# Altium schematic symbol library jlcpcb_2025_04_capacitors_extended_0402.schlib: 3594 symbols (part 2 of 20) (continued)
## 0402CG470J250NT
designator C?  Capacitance: 47pF  (hidden comment: *)
Capacitor, Ceramic (MLCC), 47pF, ±5%, 25V, C0G, ±5%, SMD 0402; Manufacturer: FH (Guangdong Fenghua Advanced Tech); Manufacturer Part Number: 0402CG470J250NT; Package Size: 0402; JLCPCB Basic Part: No; JLCPCB Part Number: C2991692; Supplier 1: LCSC; Category: Capacitors - MLCC; Supplier Part Number 1: C2991692; Tolerance: ±5%; Voltage Rating: 25V; Temperature Coefficient: C0G; RoHS: Yes; ComponentLink1Description: Datasheet; ComponentLink1URL: https://wmsc.lcsc.com/wmsc/upload/file/pdf/v2/lcsc/2204111630_FH--Guangdong-Fenghua-Advanced-Tech-0402CG470J250NT_C2991692.pdf; ComponentLink2Description: JLCPCB Part URL; ComponentLink2URL: https://jlcpcb.com/partdetail/C2991692; ComponentLink3Description: LCSC Part URL; ComponentLink3URL: https://lcsc.com/product-detail/Multilayer-Ceramic-Capacitors-MLCC---SMD-SMT_FH-Guangdong-Fenghua-Advanced-Tech-FH-Guangdong-Fenghua-Advanced-Tech-0402CG470J250NT_C2991692.html
footprint CAP-0402 (0402 (1005M) Capacitor)
pins: 1, 2

## 0402CG471J500NT
designator C?  Capacitance: 470pF  (hidden comment: *)
Capacitor, Ceramic (MLCC), 470pF, ±5%, 50V, C0G, ±5%, SMD 0402; Manufacturer: FH(Guangdong Fenghua Advanced Tech); Manufacturer Part Number: 0402CG471J500NT; Package Size: 0402; JLCPCB Basic Part: No; JLCPCB Part Number: C75274; Supplier 1: LCSC; Category: Capacitors - MLCC; Supplier Part Number 1: C75274; Tolerance: ±5%; Voltage Rating: 50V; Temperature Coefficient: C0G; RoHS: Yes; ComponentLink1Description: Datasheet; ComponentLink1URL: https://wmsc.lcsc.com/wmsc/upload/file/pdf/v2/lcsc/2304140030_FH--Guangdong-Fenghua-Advanced-Tech-0402CG471J500NT_C75274.pdf; ComponentLink2Description: JLCPCB Part URL; ComponentLink2URL: https://jlcpcb.com/partdetail/C75274; ComponentLink3Description: LCSC Part URL; ComponentLink3URL: https://lcsc.com/product-detail/Multilayer-Ceramic-Capacitors-MLCC---SMD-SMT_FH-Guangdong-Fenghua-Advanced-Tech-FH-Guangdong-Fenghua-Advanced-Tech-0402CG471J500NT_C75274.html
footprint CAP-0402 (0402 (1005M) Capacitor)
pins: 1, 2

## 0402CG500J500NT
designator C?  Capacitance: 50pF  (hidden comment: *)
Capacitor, Ceramic (MLCC), 50pF, ±5%, 50V, C0G, ±5%, SMD 0402; Manufacturer: FH(Guangdong Fenghua Advanced Tech); Manufacturer Part Number: 0402CG500J500NT; Package Size: 0402; JLCPCB Basic Part: No; JLCPCB Part Number: C501830; Supplier 1: LCSC; Category: Capacitors - MLCC; Supplier Part Number 1: C501830; Tolerance: ±5%; Voltage Rating: 50V; Temperature Coefficient: C0G; RoHS: Yes; ComponentLink1Description: Datasheet; ComponentLink1URL: https://wmsc.lcsc.com/wmsc/upload/file/pdf/v2/lcsc/2304140030_FH--Guangdong-Fenghua-Advanced-Tech-0402CG500J500NT_C501830.pdf; ComponentLink2Description: JLCPCB Part URL; ComponentLink2URL: https://jlcpcb.com/partdetail/C501830; ComponentLink3Description: LCSC Part URL; ComponentLink3URL: https://lcsc.com/product-detail/Multilayer-Ceramic-Capacitors-MLCC---SMD-SMT_FH-Guangdong-Fenghua-Advanced-Tech-FH-Guangdong-Fenghua-Advanced-Tech-0402CG500J500NT_C501830.html
footprint CAP-0402 (0402 (1005M) Capacitor)
pins: 1, 2

## 0402CG510J500NT
designator C?  Capacitance: 51pF  (hidden comment: *)
Capacitor, Ceramic (MLCC), 51pF, ±5%, 50V, C0G, ±5%, SMD 0402; Manufacturer: FH(Guangdong Fenghua Advanced Tech); Manufacturer Part Number: 0402CG510J500NT; Package Size: 0402; JLCPCB Basic Part: No; JLCPCB Part Number: C1571; Supplier 1: LCSC; Category: Capacitors - MLCC; Supplier Part Number 1: C1571; Tolerance: ±5%; Voltage Rating: 50V; Temperature Coefficient: C0G; RoHS: Yes; ComponentLink1Description: Datasheet; ComponentLink1URL: https://wmsc.lcsc.com/wmsc/upload/file/pdf/v2/lcsc/2304140030_FH--Guangdong-Fenghua-Advanced-Tech-0402CG510J500NT_C1571.pdf; ComponentLink2Description: JLCPCB Part URL; ComponentLink2URL: https://jlcpcb.com/partdetail/C1571; ComponentLink3Description: LCSC Part URL; ComponentLink3URL: https://lcsc.com/product-detail/Multilayer-Ceramic-Capacitors-MLCC---SMD-SMT_FH-Guangdong-Fenghua-Advanced-Tech-FH-Guangdong-Fenghua-Advanced-Tech-0402CG510J500NT_C1571.html
footprint CAP-0402 (0402 (1005M) Capacitor)
pins: 1, 2

## 0402CG560J500NT
designator C?  Capacitance: 56pF  (hidden comment: *)
Capacitor, Ceramic (MLCC), 56pF, ±5%, 50V, C0G, ±5%, SMD 0402; Manufacturer: FH(Guangdong Fenghua Advanced Tech); Manufacturer Part Number: 0402CG560J500NT; Package Size: 0402; JLCPCB Basic Part: No; JLCPCB Part Number: C1572; Supplier 1: LCSC; Category: Capacitors - MLCC; Supplier Part Number 1: C1572; Tolerance: ±5%; Voltage Rating: 50V; Temperature Coefficient: C0G; RoHS: Yes; ComponentLink1Description: Datasheet; ComponentLink1URL: https://wmsc.lcsc.com/wmsc/upload/file/pdf/v2/lcsc/2304140030_FH--Guangdong-Fenghua-Advanced-Tech-0402CG560J500NT_C1572.pdf; ComponentLink2Description: JLCPCB Part URL; ComponentLink2URL: https://jlcpcb.com/partdetail/C1572; ComponentLink3Description: LCSC Part URL; ComponentLink3URL: https://lcsc.com/product-detail/Multilayer-Ceramic-Capacitors-MLCC---SMD-SMT_FH-Guangdong-Fenghua-Advanced-Tech-FH-Guangdong-Fenghua-Advanced-Tech-0402CG560J500NT_C1572.html
footprint CAP-0402 (0402 (1005M) Capacitor)
pins: 1, 2

## 0402CG561J500NT
designator C?  Capacitance: 560pF  (hidden comment: *)
Capacitor, Ceramic (MLCC), 560pF, ±5%, 50V, C0G, ±5%, SMD 0402; Manufacturer: FH (Guangdong Fenghua Advanced Tech); Manufacturer Part Number: 0402CG561J500NT; Package Size: 0402; JLCPCB Basic Part: No; JLCPCB Part Number: C967570; Supplier 1: LCSC; Category: Capacitors - MLCC; Supplier Part Number 1: C967570; Tolerance: ±5%; Voltage Rating: 50V; Temperature Coefficient: C0G; RoHS: Yes; ComponentLink1Description: Datasheet; ComponentLink1URL: https://wmsc.lcsc.com/wmsc/upload/file/pdf/v2/lcsc/2304140030_FH--Guangdong-Fenghua-Advanced-Tech-0402CG561J500NT_C967570.pdf; ComponentLink2Description: JLCPCB Part URL; ComponentLink2URL: https://jlcpcb.com/partdetail/C967570; ComponentLink3Description: LCSC Part URL; ComponentLink3URL: https://lcsc.com/product-detail/Multilayer-Ceramic-Capacitors-MLCC---SMD-SMT_FH-Guangdong-Fenghua-Advanced-Tech-FH-Guangdong-Fenghua-Advanced-Tech-0402CG561J500NT_C967570.html
footprint CAP-0402 (0402 (1005M) Capacitor)
pins: 1, 2

## 0402CG620J500NT
designator C?  Capacitance: 62pF  (hidden comment: *)
Capacitor, Ceramic (MLCC), 62pF, ±5%, 50V, C0G, ±5%, SMD 0402; Manufacturer: FH(Guangdong Fenghua Advanced Tech); Manufacturer Part Number: 0402CG620J500NT; Package Size: 0402; JLCPCB Basic Part: No; JLCPCB Part Number: C33953; Supplier 1: LCSC; Category: Capacitors - MLCC; Supplier Part Number 1: C33953; Tolerance: ±5%; Voltage Rating: 50V; Temperature Coefficient: C0G; RoHS: Yes; ComponentLink1Description: Datasheet; ComponentLink1URL: https://wmsc.lcsc.com/wmsc/upload/file/pdf/v2/lcsc/2304140030_FH--Guangdong-Fenghua-Advanced-Tech-0402CG620J500NT_C33953.pdf; ComponentLink2Description: JLCPCB Part URL; ComponentLink2URL: https://jlcpcb.com/partdetail/C33953; ComponentLink3Description: LCSC Part URL; ComponentLink3URL: https://lcsc.com/product-detail/Multilayer-Ceramic-Capacitors-MLCC---SMD-SMT_FH-Guangdong-Fenghua-Advanced-Tech-FH-Guangdong-Fenghua-Advanced-Tech-0402CG620J500NT_C33953.html
footprint CAP-0402 (0402 (1005M) Capacitor)
pins: 1, 2

## 0402CG680J500NT
designator C?  Capacitance: 68pF  (hidden comment: *)
Capacitor, Ceramic (MLCC), 68pF, ±5%, 50V, C0G, ±5%, SMD 0402; Manufacturer: FH(Guangdong Fenghua Advanced Tech); Manufacturer Part Number: 0402CG680J500NT; Package Size: 0402; JLCPCB Basic Part: No; JLCPCB Part Number: C190580; Supplier 1: LCSC; Category: Capacitors - MLCC; Supplier Part Number 1: C190580; Tolerance: ±5%; Voltage Rating: 50V; Temperature Coefficient: C0G; RoHS: Yes; ComponentLink1Description: Datasheet; ComponentLink1URL: https://wmsc.lcsc.com/wmsc/upload/file/pdf/v2/lcsc/2304140030_FH--Guangdong-Fenghua-Advanced-Tech-0402CG680J500NT_C190580.pdf; ComponentLink2Description: JLCPCB Part URL; ComponentLink2URL: https://jlcpcb.com/partdetail/C190580; ComponentLink3Description: LCSC Part URL; ComponentLink3URL: https://lcsc.com/product-detail/Multilayer-Ceramic-Capacitors-MLCC---SMD-SMT_FH-Guangdong-Fenghua-Advanced-Tech-FH-Guangdong-Fenghua-Advanced-Tech-0402CG680J500NT_C190580.html
footprint CAP-0402 (0402 (1005M) Capacitor)
pins: 1, 2

## 0402CG681J500NT
designator C?  Capacitance: 680pF  (hidden comment: *)
Capacitor, Ceramic (MLCC), 680pF, ±5%, 50V, C0G, ±5%, SMD 0402; Manufacturer: FH (Guangdong Fenghua Advanced Tech); Manufacturer Part Number: 0402CG681J500NT; Package Size: 0402; JLCPCB Basic Part: No; JLCPCB Part Number: C301953; Supplier 1: LCSC; Category: Capacitors - MLCC; Supplier Part Number 1: C301953; Tolerance: ±5%; Voltage Rating: 50V; Temperature Coefficient: C0G; RoHS: Yes; ComponentLink1Description: Datasheet; ComponentLink1URL: https://wmsc.lcsc.com/wmsc/upload/file/pdf/v2/lcsc/2304140030_FH--Guangdong-Fenghua-Advanced-Tech-0402CG681J500NT_C301953.pdf; ComponentLink2Description: JLCPCB Part URL; ComponentLink2URL: https://jlcpcb.com/partdetail/C301953; ComponentLink3Description: LCSC Part URL; ComponentLink3URL: https://lcsc.com/product-detail/Multilayer-Ceramic-Capacitors-MLCC---SMD-SMT_FH-Guangdong-Fenghua-Advanced-Tech-FH-Guangdong-Fenghua-Advanced-Tech-0402CG681J500NT_C301953.html
footprint CAP-0402 (0402 (1005M) Capacitor)
pins: 1, 2

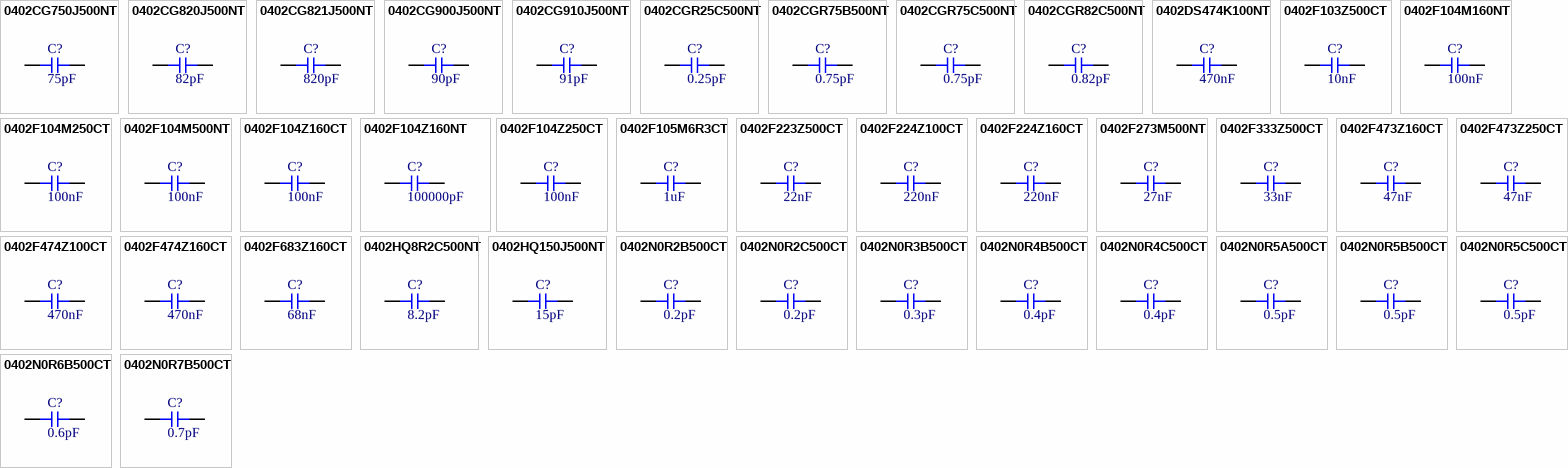
[diagram p8: symbols 0402CG750J500NT to 0402N0R7B500CT]

## 0402CG750J500NT
designator C?  Capacitance: 75pF  (hidden comment: *)
Capacitor, Ceramic (MLCC), 75pF, ±5%, 50V, C0G, ±5%, SMD 0402; Manufacturer: FH(Guangdong Fenghua Advanced Tech); Manufacturer Part Number: 0402CG750J500NT; Package Size: 0402; JLCPCB Basic Part: No; JLCPCB Part Number: C37809; Supplier 1: LCSC; Category: Capacitors - MLCC; Supplier Part Number 1: C37809; Tolerance: ±5%; Voltage Rating: 50V; Temperature Coefficient: C0G; RoHS: Yes; ComponentLink1Description: Datasheet; ComponentLink1URL: https://wmsc.lcsc.com/wmsc/upload/file/pdf/v2/lcsc/2304140030_FH--Guangdong-Fenghua-Advanced-Tech-0402CG750J500NT_C37809.pdf; ComponentLink2Description: JLCPCB Part URL; ComponentLink2URL: https://jlcpcb.com/partdetail/C37809; ComponentLink3Description: LCSC Part URL; ComponentLink3URL: https://lcsc.com/product-detail/Multilayer-Ceramic-Capacitors-MLCC---SMD-SMT_FH-Guangdong-Fenghua-Advanced-Tech-FH-Guangdong-Fenghua-Advanced-Tech-0402CG750J500NT_C37809.html
footprint CAP-0402 (0402 (1005M) Capacitor)
pins: 1, 2

## 0402CG820J500NT
designator C?  Capacitance: 82pF  (hidden comment: *)
Capacitor, Ceramic (MLCC), 82pF, ±5%, 50V, C0G, ±5%, SMD 0402; Manufacturer: FH(Guangdong Fenghua Advanced Tech); Manufacturer Part Number: 0402CG820J500NT; Package Size: 0402; JLCPCB Basic Part: No; JLCPCB Part Number: C45501; Supplier 1: LCSC; Category: Capacitors - MLCC; Supplier Part Number 1: C45501; Tolerance: ±5%; Voltage Rating: 50V; Temperature Coefficient: C0G; RoHS: Yes; ComponentLink1Description: Datasheet; ComponentLink1URL: https://wmsc.lcsc.com/wmsc/upload/file/pdf/v2/lcsc/2304140030_FH--Guangdong-Fenghua-Advanced-Tech-0402CG820J500NT_C45501.pdf; ComponentLink2Description: JLCPCB Part URL; ComponentLink2URL: https://jlcpcb.com/partdetail/C45501; ComponentLink3Description: LCSC Part URL; ComponentLink3URL: https://lcsc.com/product-detail/Multilayer-Ceramic-Capacitors-MLCC---SMD-SMT_FH-Guangdong-Fenghua-Advanced-Tech-FH-Guangdong-Fenghua-Advanced-Tech-0402CG820J500NT_C45501.html
footprint CAP-0402 (0402 (1005M) Capacitor)
pins: 1, 2

## 0402CG821J500NT
designator C?  Capacitance: 820pF  (hidden comment: *)
Capacitor, Ceramic (MLCC), 820pF, ±5%, 50V, C0G, ±5%, SMD 0402; Manufacturer: FH (Guangdong Fenghua Advanced Tech); Manufacturer Part Number: 0402CG821J500NT; Package Size: 0402; JLCPCB Basic Part: No; JLCPCB Part Number: C913875; Supplier 1: LCSC; Category: Capacitors - MLCC; Supplier Part Number 1: C913875; Tolerance: ±5%; Voltage Rating: 50V; Temperature Coefficient: C0G; RoHS: Yes; ComponentLink1Description: Datasheet; ComponentLink1URL: https://wmsc.lcsc.com/wmsc/upload/file/pdf/v2/lcsc/2304140030_FH--Guangdong-Fenghua-Advanced-Tech-0402CG821J500NT_C913875.pdf; ComponentLink2Description: JLCPCB Part URL; ComponentLink2URL: https://jlcpcb.com/partdetail/C913875; ComponentLink3Description: LCSC Part URL; ComponentLink3URL: https://lcsc.com/product-detail/Multilayer-Ceramic-Capacitors-MLCC---SMD-SMT_FH-Guangdong-Fenghua-Advanced-Tech-FH-Guangdong-Fenghua-Advanced-Tech-0402CG821J500NT_C913875.html
footprint CAP-0402 (0402 (1005M) Capacitor)
pins: 1, 2

## 0402CG900J500NT
designator C?  Capacitance: 90pF  (hidden comment: *)
Capacitor, Ceramic (MLCC), 90pF, ±5%, 50V, C0G, ±5%, SMD 0402; Manufacturer: FH(Guangdong Fenghua Advanced Tech); Manufacturer Part Number: 0402CG900J500NT; Package Size: 0402; JLCPCB Basic Part: No; JLCPCB Part Number: C501832; Supplier 1: LCSC; Category: Capacitors - MLCC; Supplier Part Number 1: C501832; Tolerance: ±5%; Voltage Rating: 50V; Temperature Coefficient: C0G; RoHS: Yes; ComponentLink1Description: Datasheet; ComponentLink1URL: https://wmsc.lcsc.com/wmsc/upload/file/pdf/v2/lcsc/2304140030_FH--Guangdong-Fenghua-Advanced-Tech-0402CG900J500NT_C501832.pdf; ComponentLink2Description: JLCPCB Part URL; ComponentLink2URL: https://jlcpcb.com/partdetail/C501832; ComponentLink3Description: LCSC Part URL; ComponentLink3URL: https://lcsc.com/product-detail/Multilayer-Ceramic-Capacitors-MLCC---SMD-SMT_FH-Guangdong-Fenghua-Advanced-Tech-FH-Guangdong-Fenghua-Advanced-Tech-0402CG900J500NT_C501832.html
footprint CAP-0402 (0402 (1005M) Capacitor)
pins: 1, 2

## 0402CG910J500NT
designator C?  Capacitance: 91pF  (hidden comment: *)
Capacitor, Ceramic (MLCC), 91pF, ±5%, 50V, C0G, ±5%, SMD 0402; Manufacturer: FH(Guangdong Fenghua Advanced Tech); Manufacturer Part Number: 0402CG910J500NT; Package Size: 0402; JLCPCB Basic Part: No; JLCPCB Part Number: C44548; Supplier 1: LCSC; Category: Capacitors - MLCC; Supplier Part Number 1: C44548; Tolerance: ±5%; Voltage Rating: 50V; Temperature Coefficient: C0G; RoHS: Yes; ComponentLink1Description: Datasheet; ComponentLink1URL: https://wmsc.lcsc.com/wmsc/upload/file/pdf/v2/lcsc/2304140030_FH--Guangdong-Fenghua-Advanced-Tech-0402CG910J500NT_C44548.pdf; ComponentLink2Description: JLCPCB Part URL; ComponentLink2URL: https://jlcpcb.com/partdetail/C44548; ComponentLink3Description: LCSC Part URL; ComponentLink3URL: https://lcsc.com/product-detail/Multilayer-Ceramic-Capacitors-MLCC---SMD-SMT_FH-Guangdong-Fenghua-Advanced-Tech-FH-Guangdong-Fenghua-Advanced-Tech-0402CG910J500NT_C44548.html
footprint CAP-0402 (0402 (1005M) Capacitor)
pins: 1, 2

## 0402CGR25C500NT
designator C?  Capacitance: 0.25pF  (hidden comment: *)
Capacitor, Ceramic (MLCC), 0.25pF, 50V, C0G, SMD 0402; Manufacturer: FH(Guangdong Fenghua Advanced Tech); Manufacturer Part Number: 0402CGR25C500NT; Package Size: 0402; JLCPCB Basic Part: No; JLCPCB Part Number: C501833; Supplier 1: LCSC; Category: Capacitors - MLCC; Supplier Part Number 1: C501833; Voltage Rating: 50V; Temperature Coefficient: C0G; RoHS: Yes; ComponentLink1Description: Datasheet; ComponentLink1URL: https://wmsc.lcsc.com/wmsc/upload/file/pdf/v2/lcsc/2304140030_FH--Guangdong-Fenghua-Advanced-Tech-0402CGR25C500NT_C501833.pdf; ComponentLink2Description: JLCPCB Part URL; ComponentLink2URL: https://jlcpcb.com/partdetail/C501833; ComponentLink3Description: LCSC Part URL; ComponentLink3URL: https://lcsc.com/product-detail/Multilayer-Ceramic-Capacitors-MLCC---SMD-SMT_FH-Guangdong-Fenghua-Advanced-Tech-FH-Guangdong-Fenghua-Advanced-Tech-0402CGR25C500NT_C501833.html
footprint CAP-0402 (0402 (1005M) Capacitor)
pins: 1, 2

## 0402CGR75B500NT
designator C?  Capacitance: 0.75pF  (hidden comment: *)
Capacitor, Ceramic (MLCC), 0.75pF, 50V, C0G, SMD 0402; Manufacturer: FH(Guangdong Fenghua Advanced Tech); Manufacturer Part Number: 0402CGR75B500NT; Package Size: 0402; JLCPCB Basic Part: No; JLCPCB Part Number: C285170; Supplier 1: LCSC; Category: Capacitors - MLCC; Supplier Part Number 1: C285170; Voltage Rating: 50V; Temperature Coefficient: C0G; RoHS: Yes; ComponentLink1Description: Datasheet; ComponentLink1URL: https://wmsc.lcsc.com/wmsc/upload/file/pdf/v2/lcsc/2304140030_FH--Guangdong-Fenghua-Advanced-Tech-0402CGR75B500NT_C285170.pdf; ComponentLink2Description: JLCPCB Part URL; ComponentLink2URL: https://jlcpcb.com/partdetail/C285170; ComponentLink3Description: LCSC Part URL; ComponentLink3URL: https://lcsc.com/product-detail/Multilayer-Ceramic-Capacitors-MLCC---SMD-SMT_FH-Guangdong-Fenghua-Advanced-Tech-FH-Guangdong-Fenghua-Advanced-Tech-0402CGR75B500NT_C285170.html
footprint CAP-0402 (0402 (1005M) Capacitor)
pins: 1, 2

## 0402CGR75C500NT
designator C?  Capacitance: 0.75pF  (hidden comment: *)
Capacitor, Ceramic (MLCC), 0.75pF, 50V, C0G, SMD 0402; Manufacturer: FH(Guangdong Fenghua Advanced Tech); Manufacturer Part Number: 0402CGR75C500NT; Package Size: 0402; JLCPCB Basic Part: No; JLCPCB Part Number: C83711; Supplier 1: LCSC; Category: Capacitors - MLCC; Supplier Part Number 1: C83711; Voltage Rating: 50V; Temperature Coefficient: C0G; RoHS: Yes; ComponentLink1Description: Datasheet; ComponentLink1URL: https://wmsc.lcsc.com/wmsc/upload/file/pdf/v2/lcsc/2304140030_FH--Guangdong-Fenghua-Advanced-Tech-0402CGR75C500NT_C83711.pdf; ComponentLink2Description: JLCPCB Part URL; ComponentLink2URL: https://jlcpcb.com/partdetail/C83711; ComponentLink3Description: LCSC Part URL; ComponentLink3URL: https://lcsc.com/product-detail/Multilayer-Ceramic-Capacitors-MLCC---SMD-SMT_FH-Guangdong-Fenghua-Advanced-Tech-FH-Guangdong-Fenghua-Advanced-Tech-0402CGR75C500NT_C83711.html
footprint CAP-0402 (0402 (1005M) Capacitor)
pins: 1, 2

## 0402CGR82C500NT
designator C?  Capacitance: 0.82pF  (hidden comment: *)
Capacitor, Ceramic (MLCC), 0.82pF, 50V, SMD 0402; Manufacturer: FH (Guangdong Fenghua Advanced Tech); Manufacturer Part Number: 0402CGR82C500NT; Package Size: 0402; JLCPCB Basic Part: No; JLCPCB Part Number: C2857972; Supplier 1: LCSC; Category: Capacitors - MLCC; Supplier Part Number 1: C2857972; Voltage Rating: 50V; RoHS: Yes; ComponentLink1Description: Datasheet; ComponentLink2Description: JLCPCB Part URL; ComponentLink2URL: https://jlcpcb.com/partdetail/C2857972; ComponentLink3Description: LCSC Part URL; ComponentLink3URL: https://lcsc.com/product-detail/Multilayer-Ceramic-Capacitors-MLCC---SMD-SMT_FH-Guangdong-Fenghua-Advanced-Tech-FH-Guangdong-Fenghua-Advanced-Tech-0402CGR82C500NT_C2857972.html
footprint CAP-0402 (0402 (1005M) Capacitor)
pins: 1, 2

## 0402DS474K100NT
designator C?  Capacitance: 470nF  (hidden comment: *)
Capacitor, Ceramic (MLCC), 470nF, ±10%, 10V, X6S, ±10%, SMD 0402; Manufacturer: FH (Guangdong Fenghua Advanced Tech); Manufacturer Part Number: 0402DS474K100NT; Package Size: 0402; JLCPCB Basic Part: No; JLCPCB Part Number: C2991589; Supplier 1: LCSC; Category: Capacitors - MLCC; Supplier Part Number 1: C2991589; Tolerance: ±10%; Voltage Rating: 10V; Temperature Coefficient: X6S; RoHS: Yes; ComponentLink1Description: Datasheet; ComponentLink1URL: https://wmsc.lcsc.com/wmsc/upload/file/pdf/v2/lcsc/2204111630_FH--Guangdong-Fenghua-Advanced-Tech-0402DS474K100NT_C2991589.pdf; ComponentLink2Description: JLCPCB Part URL; ComponentLink2URL: https://jlcpcb.com/partdetail/C2991589; ComponentLink3Description: LCSC Part URL; ComponentLink3URL: https://lcsc.com/product-detail/Multilayer-Ceramic-Capacitors-MLCC---SMD-SMT_FH-Guangdong-Fenghua-Advanced-Tech-FH-Guangdong-Fenghua-Advanced-Tech-0402DS474K100NT_C2991589.html
footprint CAP-0402 (0402 (1005M) Capacitor)
pins: 1, 2

## 0402F103Z500CT
designator C?  Capacitance: 10nF  (hidden comment: *)
Capacitor, Ceramic (MLCC), 10nF, 50V, Y5V, SMD 0402; Manufacturer: Walsin Tech Corp; Manufacturer Part Number: 0402F103Z500CT; Temperature Rating: -20%~+80%; Package Size: 0402; JLCPCB Basic Part: No; JLCPCB Part Number: C408912; Supplier 1: LCSC; Category: Capacitors - MLCC; Supplier Part Number 1: C408912; Voltage Rating: 50V; Temperature Coefficient: Y5V; RoHS: Yes; ComponentLink1Description: Datasheet; ComponentLink1URL: https://wmsc.lcsc.com/wmsc/upload/file/pdf/v2/lcsc/1912111437_Walsin-Tech-Corp-0402F103Z500CT_C408912.pdf; ComponentLink2Description: JLCPCB Part URL; ComponentLink2URL: https://jlcpcb.com/partdetail/C408912; ComponentLink3Description: LCSC Part URL; ComponentLink3URL: https://lcsc.com/product-detail/Multilayer-Ceramic-Capacitors-MLCC---SMD-SMT_Walsin-Tech-Corp-Walsin-Tech-Corp-0402F103Z500CT_C408912.html
footprint CAP-0402 (0402 (1005M) Capacitor)
pins: 1, 2

## 0402F104M160NT
designator C?  Capacitance: 100nF  (hidden comment: *)
Capacitor, Ceramic (MLCC), 100nF, ±20%, 16V, Y5V, ±20%, SMD 0402; Manufacturer: FH(Guangdong Fenghua Advanced Tech); Manufacturer Part Number: 0402F104M160NT; Package Size: 0402; JLCPCB Basic Part: No; JLCPCB Part Number: C285091; Supplier 1: LCSC; Category: Capacitors - MLCC; Supplier Part Number 1: C285091; Tolerance: ±20%; Voltage Rating: 16V; Temperature Coefficient: Y5V; RoHS: Yes; ComponentLink1Description: Datasheet; ComponentLink1URL: https://wmsc.lcsc.com/wmsc/upload/file/pdf/v2/lcsc/2304140030_FH--Guangdong-Fenghua-Advanced-Tech-0402F104M160NT_C285091.pdf; ComponentLink2Description: JLCPCB Part URL; ComponentLink2URL: https://jlcpcb.com/partdetail/C285091; ComponentLink3Description: LCSC Part URL; ComponentLink3URL: https://lcsc.com/product-detail/Multilayer-Ceramic-Capacitors-MLCC---SMD-SMT_FH-Guangdong-Fenghua-Advanced-Tech-FH-Guangdong-Fenghua-Advanced-Tech-0402F104M160NT_C285091.html
footprint CAP-0402 (0402 (1005M) Capacitor)
pins: 1, 2

## 0402F104M250CT
designator C?  Capacitance: 100nF  (hidden comment: *)
Capacitor, Ceramic (MLCC), 100nF, ±20%, 25V, Y5V, ±20%, SMD 0402; Manufacturer: Walsin Tech Corp; Manufacturer Part Number: 0402F104M250CT; Package Size: 0402; JLCPCB Basic Part: No; JLCPCB Part Number: C163180; Supplier 1: LCSC; Category: Capacitors - MLCC; Supplier Part Number 1: C163180; Tolerance: ±20%; Voltage Rating: 25V; Temperature Coefficient: Y5V; RoHS: Yes; ComponentLink1Description: Datasheet; ComponentLink1URL: https://wmsc.lcsc.com/wmsc/upload/file/pdf/v2/lcsc/2304140030_Walsin-Tech-Corp-0402F104M250CT_C163180.pdf; ComponentLink2Description: JLCPCB Part URL; ComponentLink2URL: https://jlcpcb.com/partdetail/C163180; ComponentLink3Description: LCSC Part URL; ComponentLink3URL: https://lcsc.com/product-detail/Multilayer-Ceramic-Capacitors-MLCC---SMD-SMT_Walsin-Tech-Corp-Walsin-Tech-Corp-0402F104M250CT_C163180.html
footprint CAP-0402 (0402 (1005M) Capacitor)
pins: 1, 2

## 0402F104M500NT
designator C?  Capacitance: 100nF  (hidden comment: *)
Capacitor, Ceramic (MLCC), 100nF, ±20%, 50V, Y5V, ±20%, SMD 0402; Manufacturer: FH(Guangdong Fenghua Advanced Tech); Manufacturer Part Number: 0402F104M500NT; Package Size: 0402; JLCPCB Basic Part: No; JLCPCB Part Number: C1581; Supplier 1: LCSC; Category: Capacitors - MLCC; Supplier Part Number 1: C1581; Tolerance: ±20%; Voltage Rating: 50V; Temperature Coefficient: Y5V; RoHS: Yes; ComponentLink1Description: Datasheet; ComponentLink1URL: https://wmsc.lcsc.com/wmsc/upload/file/pdf/v2/lcsc/2304140030_FH--Guangdong-Fenghua-Advanced-Tech-0402F104M500NT_C1581.pdf; ComponentLink2Description: JLCPCB Part URL; ComponentLink2URL: https://jlcpcb.com/partdetail/C1581; ComponentLink3Description: LCSC Part URL; ComponentLink3URL: https://lcsc.com/product-detail/Multilayer-Ceramic-Capacitors-MLCC---SMD-SMT_FH-Guangdong-Fenghua-Advanced-Tech-FH-Guangdong-Fenghua-Advanced-Tech-0402F104M500NT_C1581.html
footprint CAP-0402 (0402 (1005M) Capacitor)
pins: 1, 2

## 0402F104Z160CT
designator C?  Capacitance: 100nF  (hidden comment: *)
Capacitor, Ceramic (MLCC), 100nF, 16V, Y5V, SMD 0402; Manufacturer: Walsin Tech Corp; Manufacturer Part Number: 0402F104Z160CT; Temperature Rating: -20%~+80%; Package Size: 0402; JLCPCB Basic Part: No; JLCPCB Part Number: C123453; Supplier 1: LCSC; Category: Capacitors - MLCC; Supplier Part Number 1: C123453; Voltage Rating: 16V; Temperature Coefficient: Y5V; RoHS: Yes; ComponentLink1Description: Datasheet; ComponentLink1URL: https://wmsc.lcsc.com/wmsc/upload/file/pdf/v2/lcsc/2304140030_Walsin-Tech-Corp-0402F104Z160CT_C123453.pdf; ComponentLink2Description: JLCPCB Part URL; ComponentLink2URL: https://jlcpcb.com/partdetail/C123453; ComponentLink3Description: LCSC Part URL; ComponentLink3URL: https://lcsc.com/product-detail/Multilayer-Ceramic-Capacitors-MLCC---SMD-SMT_Walsin-Tech-Corp-Walsin-Tech-Corp-0402F104Z160CT_C123453.html
footprint CAP-0402 (0402 (1005M) Capacitor)
pins: 1, 2

## 0402F104Z160NT
designator C?  Capacitance: 100000pF  (hidden comment: *)
Capacitor, Ceramic (MLCC), 100000pF, 16V, Y5V, SMD 0402; Manufacturer: FH (Guangdong Fenghua Advanced Tech); Manufacturer Part Number: 0402F104Z160NT; Temperature Rating: -20%~+80%; Package Size: 0402; JLCPCB Basic Part: No; JLCPCB Part Number: C2838746; Supplier 1: LCSC; Category: Capacitors - MLCC; Supplier Part Number 1: C2838746; Voltage Rating: 16V; Temperature Coefficient: Y5V; RoHS: Yes; ComponentLink1Description: Datasheet; ComponentLink1URL: https://wmsc.lcsc.com/wmsc/upload/file/pdf/v2/lcsc/2202131930_FH--Guangdong-Fenghua-Advanced-Tech-0402F104Z160NT_C2838746.pdf; ComponentLink2Description: JLCPCB Part URL; ComponentLink2URL: https://jlcpcb.com/partdetail/C2838746; ComponentLink3Description: LCSC Part URL; ComponentLink3URL: https://lcsc.com/product-detail/Multilayer-Ceramic-Capacitors-MLCC---SMD-SMT_FH-Guangdong-Fenghua-Advanced-Tech-FH-Guangdong-Fenghua-Advanced-Tech-0402F104Z160NT_C2838746.html
footprint CAP-0402 (0402 (1005M) Capacitor)
pins: 1, 2

## 0402F104Z250CT
designator C?  Capacitance: 100nF  (hidden comment: *)
Capacitor, Ceramic (MLCC), 100nF, 25V, Y5V, SMD 0402; Manufacturer: Walsin Tech Corp; Manufacturer Part Number: 0402F104Z250CT; Temperature Rating: -20%~+80%; Package Size: 0402; JLCPCB Basic Part: No; JLCPCB Part Number: C301958; Supplier 1: LCSC; Category: Capacitors - MLCC; Supplier Part Number 1: C301958; Voltage Rating: 25V; Temperature Coefficient: Y5V; RoHS: Yes; ComponentLink1Description: Datasheet; ComponentLink1URL: https://wmsc.lcsc.com/wmsc/upload/file/pdf/v2/lcsc/2304140030_Walsin-Tech-Corp-0402F104Z250CT_C301958.pdf; ComponentLink2Description: JLCPCB Part URL; ComponentLink2URL: https://jlcpcb.com/partdetail/C301958; ComponentLink3Description: LCSC Part URL; ComponentLink3URL: https://lcsc.com/product-detail/Multilayer-Ceramic-Capacitors-MLCC---SMD-SMT_Walsin-Tech-Corp-Walsin-Tech-Corp-0402F104Z250CT_C301958.html
footprint CAP-0402 (0402 (1005M) Capacitor)
pins: 1, 2

## 0402F105M6R3CT
designator C?  Capacitance: 1uF  (hidden comment: *)
Capacitor, Ceramic (MLCC), 1uF, ±20%, 6.3V, Y5V, ±20%, SMD 0402; Manufacturer: Walsin Tech Corp; Manufacturer Part Number: 0402F105M6R3CT; Package Size: 0402; JLCPCB Basic Part: No; JLCPCB Part Number: C408910; Supplier 1: LCSC; Category: Capacitors - MLCC; Supplier Part Number 1: C408910; Tolerance: ±20%; Voltage Rating: 6.3V; Temperature Coefficient: Y5V; RoHS: Yes; ComponentLink1Description: Datasheet; ComponentLink1URL: https://wmsc.lcsc.com/wmsc/upload/file/pdf/v2/lcsc/2304140030_Walsin-Tech-Corp-0402F105M6R3CT_C408910.pdf; ComponentLink2Description: JLCPCB Part URL; ComponentLink2URL: https://jlcpcb.com/partdetail/C408910; ComponentLink3Description: LCSC Part URL; ComponentLink3URL: https://lcsc.com/product-detail/Multilayer-Ceramic-Capacitors-MLCC---SMD-SMT_Walsin-Tech-Corp-Walsin-Tech-Corp-0402F105M6R3CT_C408910.html
footprint CAP-0402 (0402 (1005M) Capacitor)
pins: 1, 2

## 0402F223Z500CT
designator C?  Capacitance: 22nF  (hidden comment: *)
Capacitor, Ceramic (MLCC), 22nF, 50V, Y5V, SMD 0402; Manufacturer: Walsin Tech Corp; Manufacturer Part Number: 0402F223Z500CT; Temperature Rating: -20%~+80%; Package Size: 0402; JLCPCB Basic Part: No; JLCPCB Part Number: C387930; Supplier 1: LCSC; Category: Capacitors - MLCC; Supplier Part Number 1: C387930; Voltage Rating: 50V; Temperature Coefficient: Y5V; RoHS: Yes; ComponentLink1Description: Datasheet; ComponentLink1URL: https://wmsc.lcsc.com/wmsc/upload/file/pdf/v2/lcsc/2304140030_Walsin-Tech-Corp-0402F223Z500CT_C387930.pdf; ComponentLink2Description: JLCPCB Part URL; ComponentLink2URL: https://jlcpcb.com/partdetail/C387930; ComponentLink3Description: LCSC Part URL; ComponentLink3URL: https://lcsc.com/product-detail/Multilayer-Ceramic-Capacitors-MLCC---SMD-SMT_Walsin-Tech-Corp-Walsin-Tech-Corp-0402F223Z500CT_C387930.html
footprint CAP-0402 (0402 (1005M) Capacitor)
pins: 1, 2

## 0402F224Z100CT
designator C?  Capacitance: 220nF  (hidden comment: *)
Capacitor, Ceramic (MLCC), 220nF, 10V, Y5V, SMD 0402; Manufacturer: Walsin Tech Corp; Manufacturer Part Number: 0402F224Z100CT; Temperature Rating: -20%~+80%; Package Size: 0402; JLCPCB Basic Part: No; JLCPCB Part Number: C123456; Supplier 1: LCSC; Category: Capacitors - MLCC; Supplier Part Number 1: C123456; Voltage Rating: 10V; Temperature Coefficient: Y5V; RoHS: Yes; ComponentLink1Description: Datasheet; ComponentLink1URL: https://wmsc.lcsc.com/wmsc/upload/file/pdf/v2/lcsc/2304140030_Walsin-Tech-Corp-0402F224Z100CT_C123456.pdf; ComponentLink2Description: JLCPCB Part URL; ComponentLink2URL: https://jlcpcb.com/partdetail/C123456; ComponentLink3Description: LCSC Part URL; ComponentLink3URL: https://lcsc.com/product-detail/Multilayer-Ceramic-Capacitors-MLCC---SMD-SMT_Walsin-Tech-Corp-Walsin-Tech-Corp-0402F224Z100CT_C123456.html
footprint CAP-0402 (0402 (1005M) Capacitor)
pins: 1, 2

## 0402F224Z160CT
designator C?  Capacitance: 220nF  (hidden comment: *)
Capacitor, Ceramic (MLCC), 220nF, 16V, Y5V, SMD 0402; Manufacturer: Walsin Tech Corp; Manufacturer Part Number: 0402F224Z160CT; Temperature Rating: -20%~+80%; Package Size: 0402; JLCPCB Basic Part: No; JLCPCB Part Number: C384807; Supplier 1: LCSC; Category: Capacitors - MLCC; Supplier Part Number 1: C384807; Voltage Rating: 16V; Temperature Coefficient: Y5V; RoHS: Yes; ComponentLink1Description: Datasheet; ComponentLink1URL: https://wmsc.lcsc.com/wmsc/upload/file/pdf/v2/lcsc/2304140030_Walsin-Tech-Corp-0402F224Z160CT_C384807.pdf; ComponentLink2Description: JLCPCB Part URL; ComponentLink2URL: https://jlcpcb.com/partdetail/C384807; ComponentLink3Description: LCSC Part URL; ComponentLink3URL: https://lcsc.com/product-detail/Multilayer-Ceramic-Capacitors-MLCC---SMD-SMT_Walsin-Tech-Corp-Walsin-Tech-Corp-0402F224Z160CT_C384807.html
footprint CAP-0402 (0402 (1005M) Capacitor)
pins: 1, 2

## 0402F273M500NT
designator C?  Capacitance: 27nF  (hidden comment: *)
Capacitor, Ceramic (MLCC), 27nF, ±20%, 50V, Y5V, ±20%, SMD 0402; Manufacturer: FH(Guangdong Fenghua Advanced Tech); Manufacturer Part Number: 0402F273M500NT; Package Size: 0402; JLCPCB Basic Part: No; JLCPCB Part Number: C49879; Supplier 1: LCSC; Category: Capacitors - MLCC; Supplier Part Number 1: C49879; Tolerance: ±20%; Voltage Rating: 50V; Temperature Coefficient: Y5V; RoHS: Yes; ComponentLink1Description: Datasheet; ComponentLink1URL: https://wmsc.lcsc.com/wmsc/upload/file/pdf/v2/lcsc/2304140030_FH--Guangdong-Fenghua-Advanced-Tech-0402F273M500NT_C49879.pdf; ComponentLink2Description: JLCPCB Part URL; ComponentLink2URL: https://jlcpcb.com/partdetail/C49879; ComponentLink3Description: LCSC Part URL; ComponentLink3URL: https://lcsc.com/product-detail/Multilayer-Ceramic-Capacitors-MLCC---SMD-SMT_FH-Guangdong-Fenghua-Advanced-Tech-FH-Guangdong-Fenghua-Advanced-Tech-0402F273M500NT_C49879.html
footprint CAP-0402 (0402 (1005M) Capacitor)
pins: 1, 2

## 0402F333Z500CT
designator C?  Capacitance: 33nF  (hidden comment: *)
Capacitor, Ceramic (MLCC), 33nF, 50V, Y5V, SMD 0402; Manufacturer: Walsin Tech Corp; Manufacturer Part Number: 0402F333Z500CT; Temperature Rating: -20%~+80%; Package Size: 0402; JLCPCB Basic Part: No; JLCPCB Part Number: C387932; Supplier 1: LCSC; Category: Capacitors - MLCC; Supplier Part Number 1: C387932; Voltage Rating: 50V; Temperature Coefficient: Y5V; RoHS: Yes; ComponentLink1Description: Datasheet; ComponentLink1URL: https://wmsc.lcsc.com/wmsc/upload/file/pdf/v2/lcsc/2304140030_Walsin-Tech-Corp-0402F333Z500CT_C387932.pdf; ComponentLink2Description: JLCPCB Part URL; ComponentLink2URL: https://jlcpcb.com/partdetail/C387932; ComponentLink3Description: LCSC Part URL; ComponentLink3URL: https://lcsc.com/product-detail/Multilayer-Ceramic-Capacitors-MLCC---SMD-SMT_Walsin-Tech-Corp-Walsin-Tech-Corp-0402F333Z500CT_C387932.html
footprint CAP-0402 (0402 (1005M) Capacitor)
pins: 1, 2

## 0402F473Z160CT
designator C?  Capacitance: 47nF  (hidden comment: *)
Capacitor, Ceramic (MLCC), 47nF, 16V, Y5V, SMD 0402; Manufacturer: Walsin Tech Corp; Manufacturer Part Number: 0402F473Z160CT; Temperature Rating: -20%~+80%; Package Size: 0402; JLCPCB Basic Part: No; JLCPCB Part Number: C387934; Supplier 1: LCSC; Category: Capacitors - MLCC; Supplier Part Number 1: C387934; Voltage Rating: 16V; Temperature Coefficient: Y5V; RoHS: Yes; ComponentLink1Description: Datasheet; ComponentLink1URL: https://wmsc.lcsc.com/wmsc/upload/file/pdf/v2/lcsc/2304140030_Walsin-Tech-Corp-0402F473Z160CT_C387934.pdf; ComponentLink2Description: JLCPCB Part URL; ComponentLink2URL: https://jlcpcb.com/partdetail/C387934; ComponentLink3Description: LCSC Part URL; ComponentLink3URL: https://lcsc.com/product-detail/Multilayer-Ceramic-Capacitors-MLCC---SMD-SMT_Walsin-Tech-Corp-Walsin-Tech-Corp-0402F473Z160CT_C387934.html
footprint CAP-0402 (0402 (1005M) Capacitor)
pins: 1, 2

## 0402F473Z250CT
designator C?  Capacitance: 47nF  (hidden comment: *)
Capacitor, Ceramic (MLCC), 47nF, 25V, Y5V, SMD 0402; Manufacturer: Walsin Tech Corp; Manufacturer Part Number: 0402F473Z250CT; Temperature Rating: -20%~+80%; Package Size: 0402; JLCPCB Basic Part: No; JLCPCB Part Number: C387935; Supplier 1: LCSC; Category: Capacitors - MLCC; Supplier Part Number 1: C387935; Voltage Rating: 25V; Temperature Coefficient: Y5V; RoHS: Yes; ComponentLink1Description: Datasheet; ComponentLink1URL: https://wmsc.lcsc.com/wmsc/upload/file/pdf/v2/lcsc/2304140030_Walsin-Tech-Corp-0402F473Z250CT_C387935.pdf; ComponentLink2Description: JLCPCB Part URL; ComponentLink2URL: https://jlcpcb.com/partdetail/C387935; ComponentLink3Description: LCSC Part URL; ComponentLink3URL: https://lcsc.com/product-detail/Multilayer-Ceramic-Capacitors-MLCC---SMD-SMT_Walsin-Tech-Corp-Walsin-Tech-Corp-0402F473Z250CT_C387935.html
footprint CAP-0402 (0402 (1005M) Capacitor)
pins: 1, 2

## 0402F474Z100CT
designator C?  Capacitance: 470nF  (hidden comment: *)
Capacitor, Ceramic (MLCC), 470nF, 10V, Y5V, SMD 0402; Manufacturer: Walsin Tech Corp; Manufacturer Part Number: 0402F474Z100CT; Temperature Rating: -20%~+80%; Package Size: 0402; JLCPCB Basic Part: No; JLCPCB Part Number: C123457; Supplier 1: LCSC; Category: Capacitors - MLCC; Supplier Part Number 1: C123457; Voltage Rating: 10V; Temperature Coefficient: Y5V; RoHS: Yes; ComponentLink1Description: Datasheet; ComponentLink1URL: https://wmsc.lcsc.com/wmsc/upload/file/pdf/v2/lcsc/2304140030_Walsin-Tech-Corp-0402F474Z100CT_C123457.pdf; ComponentLink2Description: JLCPCB Part URL; ComponentLink2URL: https://jlcpcb.com/partdetail/C123457; ComponentLink3Description: LCSC Part URL; ComponentLink3URL: https://lcsc.com/product-detail/Multilayer-Ceramic-Capacitors-MLCC---SMD-SMT_Walsin-Tech-Corp-Walsin-Tech-Corp-0402F474Z100CT_C123457.html
footprint CAP-0402 (0402 (1005M) Capacitor)
pins: 1, 2

## 0402F474Z160CT
designator C?  Capacitance: 470nF  (hidden comment: *)
Capacitor, Ceramic (MLCC), 470nF, 16V, Y5V, SMD 0402; Manufacturer: Walsin Tech Corp; Manufacturer Part Number: 0402F474Z160CT; Temperature Rating: -20%~+80%; Package Size: 0402; JLCPCB Basic Part: No; JLCPCB Part Number: C387936; Supplier 1: LCSC; Category: Capacitors - MLCC; Supplier Part Number 1: C387936; Voltage Rating: 16V; Temperature Coefficient: Y5V; RoHS: Yes; ComponentLink1Description: Datasheet; ComponentLink1URL: https://wmsc.lcsc.com/wmsc/upload/file/pdf/v2/lcsc/2304140030_Walsin-Tech-Corp-0402F474Z160CT_C387936.pdf; ComponentLink2Description: JLCPCB Part URL; ComponentLink2URL: https://jlcpcb.com/partdetail/C387936; ComponentLink3Description: LCSC Part URL; ComponentLink3URL: https://lcsc.com/product-detail/Multilayer-Ceramic-Capacitors-MLCC---SMD-SMT_Walsin-Tech-Corp-Walsin-Tech-Corp-0402F474Z160CT_C387936.html
footprint CAP-0402 (0402 (1005M) Capacitor)
pins: 1, 2

## 0402F683Z160CT
designator C?  Capacitance: 68nF  (hidden comment: *)
Capacitor, Ceramic (MLCC), 68nF, 16V, Y5V, SMD 0402; Manufacturer: Walsin Tech Corp; Manufacturer Part Number: 0402F683Z160CT; Temperature Rating: -20%~+80%; Package Size: 0402; JLCPCB Basic Part: No; JLCPCB Part Number: C388115; Supplier 1: LCSC; Category: Capacitors - MLCC; Supplier Part Number 1: C388115; Voltage Rating: 16V; Temperature Coefficient: Y5V; RoHS: Yes; ComponentLink1Description: Datasheet; ComponentLink1URL: https://wmsc.lcsc.com/wmsc/upload/file/pdf/v2/lcsc/2304140030_Walsin-Tech-Corp-0402F683Z160CT_C388115.pdf; ComponentLink2Description: JLCPCB Part URL; ComponentLink2URL: https://jlcpcb.com/partdetail/C388115; ComponentLink3Description: LCSC Part URL; ComponentLink3URL: https://lcsc.com/product-detail/Multilayer-Ceramic-Capacitors-MLCC---SMD-SMT_Walsin-Tech-Corp-Walsin-Tech-Corp-0402F683Z160CT_C388115.html
footprint CAP-0402 (0402 (1005M) Capacitor)
pins: 1, 2

## 0402HQ8R2C500NT
designator C?  Capacitance: 8.2pF  (hidden comment: *)
Capacitor, Ceramic (MLCC), 8.2pF, 50V, C0G, SMD 0402; Manufacturer: FH(Guangdong Fenghua Advanced Tech); Manufacturer Part Number: 0402HQ8R2C500NT; Package Size: 0402; JLCPCB Basic Part: No; JLCPCB Part Number: C285178; Supplier 1: LCSC; Category: Capacitors - MLCC; Supplier Part Number 1: C285178; Voltage Rating: 50V; Temperature Coefficient: C0G; RoHS: Yes; ComponentLink1Description: Datasheet; ComponentLink1URL: https://wmsc.lcsc.com/wmsc/upload/file/pdf/v2/lcsc/1811141628_FH--Guangdong-Fenghua-Advanced-Tech-0402HQ8R2C500NT_C285178.pdf; ComponentLink2Description: JLCPCB Part URL; ComponentLink2URL: https://jlcpcb.com/partdetail/C285178; ComponentLink3Description: LCSC Part URL; ComponentLink3URL: https://lcsc.com/product-detail/Multilayer-Ceramic-Capacitors-MLCC---SMD-SMT_FH-Guangdong-Fenghua-Advanced-Tech-FH-Guangdong-Fenghua-Advanced-Tech-0402HQ8R2C500NT_C285178.html
footprint CAP-0402 (0402 (1005M) Capacitor)
pins: 1, 2

## 0402HQ150J500NT
designator C?  Capacitance: 15pF  (hidden comment: *)
Capacitor, Ceramic (MLCC), 15pF, ±5%, 50V, C0G, ±5%, SMD 0402; Manufacturer: FH(Guangdong Fenghua Advanced Tech); Manufacturer Part Number: 0402HQ150J500NT; Package Size: 0402; JLCPCB Basic Part: No; JLCPCB Part Number: C285173; Supplier 1: LCSC; Category: Capacitors - MLCC; Supplier Part Number 1: C285173; Tolerance: ±5%; Voltage Rating: 50V; Temperature Coefficient: C0G; RoHS: Yes; ComponentLink1Description: Datasheet; ComponentLink1URL: https://wmsc.lcsc.com/wmsc/upload/file/pdf/v2/lcsc/2304140030_FH--Guangdong-Fenghua-Advanced-Tech-0402HQ150J500NT_C285173.pdf; ComponentLink2Description: JLCPCB Part URL; ComponentLink2URL: https://jlcpcb.com/partdetail/C285173; ComponentLink3Description: LCSC Part URL; ComponentLink3URL: https://lcsc.com/product-detail/Multilayer-Ceramic-Capacitors-MLCC---SMD-SMT_FH-Guangdong-Fenghua-Advanced-Tech-FH-Guangdong-Fenghua-Advanced-Tech-0402HQ150J500NT_C285173.html
footprint CAP-0402 (0402 (1005M) Capacitor)
pins: 1, 2

## 0402N0R2B500CT
designator C?  Capacitance: 0.2pF  (hidden comment: *)
Capacitor, Ceramic (MLCC), 0.2pF, 50V, NP0, SMD 0402; Manufacturer: Walsin Tech Corp; Manufacturer Part Number: 0402N0R2B500CT; Package Size: 0402; JLCPCB Basic Part: No; JLCPCB Part Number: C387963; Supplier 1: LCSC; Category: Capacitors - MLCC; Supplier Part Number 1: C387963; Voltage Rating: 50V; Temperature Coefficient: NP0; RoHS: Yes; ComponentLink1Description: Datasheet; ComponentLink1URL: https://wmsc.lcsc.com/wmsc/upload/file/pdf/v2/lcsc/2304140030_Walsin-Tech-Corp-0402N0R2B500CT_C387963.pdf; ComponentLink2Description: JLCPCB Part URL; ComponentLink2URL: https://jlcpcb.com/partdetail/C387963; ComponentLink3Description: LCSC Part URL; ComponentLink3URL: https://lcsc.com/product-detail/Multilayer-Ceramic-Capacitors-MLCC---SMD-SMT_Walsin-Tech-Corp-Walsin-Tech-Corp-0402N0R2B500CT_C387963.html
footprint CAP-0402 (0402 (1005M) Capacitor)
pins: 1, 2

## 0402N0R2C500CT
designator C?  Capacitance: 0.2pF  (hidden comment: *)
Capacitor, Ceramic (MLCC), 0.2pF, 50V, NP0, SMD 0402; Manufacturer: Walsin Tech Corp; Manufacturer Part Number: 0402N0R2C500CT; Package Size: 0402; JLCPCB Basic Part: No; JLCPCB Part Number: C295949; Supplier 1: LCSC; Category: Capacitors - MLCC; Supplier Part Number 1: C295949; Voltage Rating: 50V; Temperature Coefficient: NP0; RoHS: Yes; ComponentLink1Description: Datasheet; ComponentLink1URL: https://wmsc.lcsc.com/wmsc/upload/file/pdf/v2/lcsc/2304140030_Walsin-Tech-Corp-0402N0R2C500CT_C295949.pdf; ComponentLink2Description: JLCPCB Part URL; ComponentLink2URL: https://jlcpcb.com/partdetail/C295949; ComponentLink3Description: LCSC Part URL; ComponentLink3URL: https://lcsc.com/product-detail/Multilayer-Ceramic-Capacitors-MLCC---SMD-SMT_Walsin-Tech-Corp-Walsin-Tech-Corp-0402N0R2C500CT_C295949.html
footprint CAP-0402 (0402 (1005M) Capacitor)
pins: 1, 2

## 0402N0R3B500CT
designator C?  Capacitance: 0.3pF  (hidden comment: *)
Capacitor, Ceramic (MLCC), 0.3pF, 50V, NP0, SMD 0402; Manufacturer: Walsin Tech Corp; Manufacturer Part Number: 0402N0R3B500CT; Package Size: 0402; JLCPCB Basic Part: No; JLCPCB Part Number: C295950; Supplier 1: LCSC; Category: Capacitors - MLCC; Supplier Part Number 1: C295950; Voltage Rating: 50V; Temperature Coefficient: NP0; RoHS: Yes; ComponentLink1Description: Datasheet; ComponentLink1URL: https://wmsc.lcsc.com/wmsc/upload/file/pdf/v2/lcsc/2304140030_Walsin-Tech-Corp-0402N0R3B500CT_C295950.pdf; ComponentLink2Description: JLCPCB Part URL; ComponentLink2URL: https://jlcpcb.com/partdetail/C295950; ComponentLink3Description: LCSC Part URL; ComponentLink3URL: https://lcsc.com/product-detail/Multilayer-Ceramic-Capacitors-MLCC---SMD-SMT_Walsin-Tech-Corp-Walsin-Tech-Corp-0402N0R3B500CT_C295950.html
footprint CAP-0402 (0402 (1005M) Capacitor)
pins: 1, 2

## 0402N0R4B500CT
designator C?  Capacitance: 0.4pF  (hidden comment: *)
Capacitor, Ceramic (MLCC), 0.4pF, 50V, NP0, SMD 0402; Manufacturer: Walsin Tech Corp; Manufacturer Part Number: 0402N0R4B500CT; Package Size: 0402; JLCPCB Basic Part: No; JLCPCB Part Number: C2918574; Supplier 1: LCSC; Category: Capacitors - MLCC; Supplier Part Number 1: C2918574; Voltage Rating: 50V; Temperature Coefficient: NP0; RoHS: Yes; ComponentLink1Description: Datasheet; ComponentLink1URL: https://wmsc.lcsc.com/wmsc/upload/file/pdf/v2/lcsc/2111171830_Walsin-Tech-Corp-0402N0R4B500CT_C2918574.pdf; ComponentLink2Description: JLCPCB Part URL; ComponentLink2URL: https://jlcpcb.com/partdetail/C2918574; ComponentLink3Description: LCSC Part URL; ComponentLink3URL: https://lcsc.com/product-detail/Multilayer-Ceramic-Capacitors-MLCC---SMD-SMT_Walsin-Tech-Corp-Walsin-Tech-Corp-0402N0R4B500CT_C2918574.html
footprint CAP-0402 (0402 (1005M) Capacitor)
pins: 1, 2

## 0402N0R4C500CT
designator C?  Capacitance: 0.4pF  (hidden comment: *)
Capacitor, Ceramic (MLCC), 0.4pF, 50V, NP0, SMD 0402; Manufacturer: Walsin Tech Corp; Manufacturer Part Number: 0402N0R4C500CT; Package Size: 0402; JLCPCB Basic Part: No; JLCPCB Part Number: C387964; Supplier 1: LCSC; Category: Capacitors - MLCC; Supplier Part Number 1: C387964; Voltage Rating: 50V; Temperature Coefficient: NP0; RoHS: Yes; ComponentLink1Description: Datasheet; ComponentLink1URL: https://wmsc.lcsc.com/wmsc/upload/file/pdf/v2/lcsc/2304140030_Walsin-Tech-Corp-0402N0R4C500CT_C387964.pdf; ComponentLink2Description: JLCPCB Part URL; ComponentLink2URL: https://jlcpcb.com/partdetail/C387964; ComponentLink3Description: LCSC Part URL; ComponentLink3URL: https://lcsc.com/product-detail/Multilayer-Ceramic-Capacitors-MLCC---SMD-SMT_Walsin-Tech-Corp-Walsin-Tech-Corp-0402N0R4C500CT_C387964.html
footprint CAP-0402 (0402 (1005M) Capacitor)
pins: 1, 2

## 0402N0R5A500CT
designator C?  Capacitance: 0.5pF  (hidden comment: *)
Capacitor, Ceramic (MLCC), 0.5pF, 50V, NP0, SMD 0402; Manufacturer: Walsin Tech Corp; Manufacturer Part Number: 0402N0R5A500CT; Package Size: 0402; JLCPCB Basic Part: No; JLCPCB Part Number: C301959; Supplier 1: LCSC; Category: Capacitors - MLCC; Supplier Part Number 1: C301959; Voltage Rating: 50V; Temperature Coefficient: NP0; RoHS: Yes; ComponentLink1Description: Datasheet; ComponentLink1URL: https://wmsc.lcsc.com/wmsc/upload/file/pdf/v2/lcsc/2304140030_Walsin-Tech-Corp-0402N0R5A500CT_C301959.pdf; ComponentLink2Description: JLCPCB Part URL; ComponentLink2URL: https://jlcpcb.com/partdetail/C301959; ComponentLink3Description: LCSC Part URL; ComponentLink3URL: https://lcsc.com/product-detail/Multilayer-Ceramic-Capacitors-MLCC---SMD-SMT_Walsin-Tech-Corp-Walsin-Tech-Corp-0402N0R5A500CT_C301959.html
footprint CAP-0402 (0402 (1005M) Capacitor)
pins: 1, 2

## 0402N0R5B500CT
designator C?  Capacitance: 0.5pF  (hidden comment: *)
Capacitor, Ceramic (MLCC), 0.5pF, 50V, NP0, SMD 0402; Manufacturer: Walsin Tech Corp; Manufacturer Part Number: 0402N0R5B500CT; Package Size: 0402; JLCPCB Basic Part: No; JLCPCB Part Number: C295951; Supplier 1: LCSC; Category: Capacitors - MLCC; Supplier Part Number 1: C295951; Voltage Rating: 50V; Temperature Coefficient: NP0; RoHS: Yes; ComponentLink1Description: Datasheet; ComponentLink1URL: https://wmsc.lcsc.com/wmsc/upload/file/pdf/v2/lcsc/2304140030_Walsin-Tech-Corp-0402N0R5B500CT_C295951.pdf; ComponentLink2Description: JLCPCB Part URL; ComponentLink2URL: https://jlcpcb.com/partdetail/C295951; ComponentLink3Description: LCSC Part URL; ComponentLink3URL: https://lcsc.com/product-detail/Multilayer-Ceramic-Capacitors-MLCC---SMD-SMT_Walsin-Tech-Corp-Walsin-Tech-Corp-0402N0R5B500CT_C295951.html
footprint CAP-0402 (0402 (1005M) Capacitor)
pins: 1, 2

## 0402N0R5C500CT
designator C?  Capacitance: 0.5pF  (hidden comment: *)
Capacitor, Ceramic (MLCC), 0.5pF, 50V, NP0, SMD 0402; Manufacturer: Walsin Tech Corp; Manufacturer Part Number: 0402N0R5C500CT; Package Size: 0402; JLCPCB Basic Part: No; JLCPCB Part Number: C152789; Supplier 1: LCSC; Category: Capacitors - MLCC; Supplier Part Number 1: C152789; Voltage Rating: 50V; Temperature Coefficient: NP0; RoHS: Yes; ComponentLink1Description: Datasheet; ComponentLink1URL: https://wmsc.lcsc.com/wmsc/upload/file/pdf/v2/lcsc/2304140030_Walsin-Tech-Corp-0402N0R5C500CT_C152789.pdf; ComponentLink2Description: JLCPCB Part URL; ComponentLink2URL: https://jlcpcb.com/partdetail/C152789; ComponentLink3Description: LCSC Part URL; ComponentLink3URL: https://lcsc.com/product-detail/Multilayer-Ceramic-Capacitors-MLCC---SMD-SMT_Walsin-Tech-Corp-Walsin-Tech-Corp-0402N0R5C500CT_C152789.html
footprint CAP-0402 (0402 (1005M) Capacitor)
pins: 1, 2